# Altium integrated library Cap-El.IntLib: 64 symbols
Pins are listed as number, name and electrical type; pins without a type are passive.

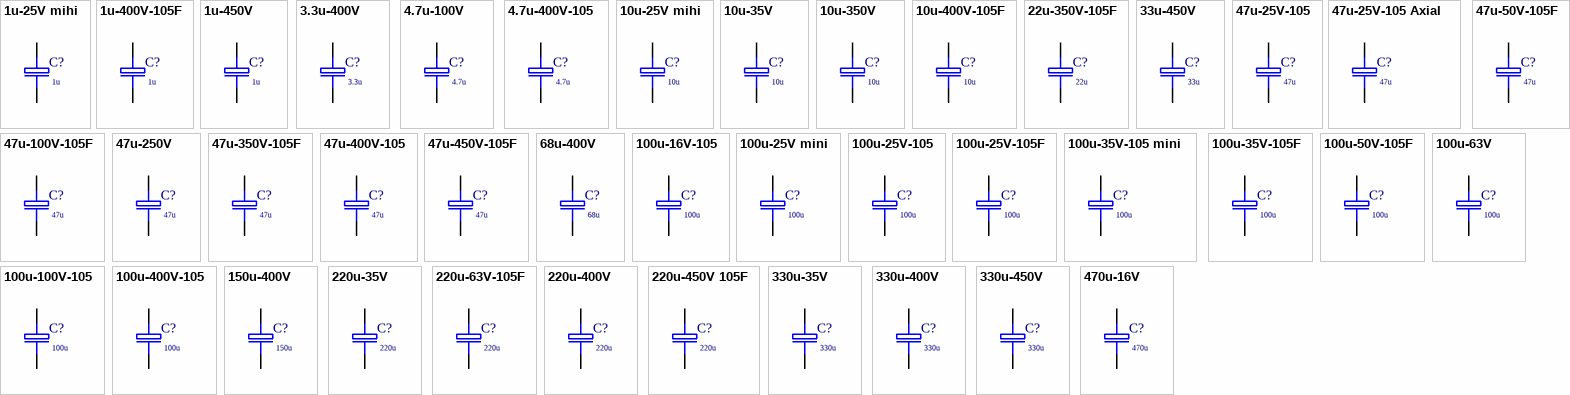
[diagram p0: symbols 1u-25V mihi to 470u-16V]

## 1u-25V mihi
designator C?, comment 1u
25V h7; Price: 0.04; Value: 1u
footprint El-d4-h7-F2.54
simulation model C (Capacitor)
signal-integrity model C
pins: 1, 2
1 alternate drawing of the same symbol

## 1u-400V-105F
designator C?, comment 1u
400V 105F; Price: 0.09; Value: 1u
footprint El-d8-h12-F3.81
simulation model C (Capacitor)
signal-integrity model C
pins: 1, 2
1 alternate drawing of the same symbol

## 1u-450V
designator C?, comment 1u
450V; Price: 0.07; Value: 1u
footprint El-d8-h12-F3.81
simulation model C (Capacitor)
signal-integrity model C
pins: 1, 2
1 alternate drawing of the same symbol

## 3.3u-400V
designator C?, comment 3.3u
400V; Price: 0.11; Value: 3.3u
footprint El-d10-h16-F5.08
simulation model C (Capacitor)
signal-integrity model C
pins: 1, 2
1 alternate drawing of the same symbol

## 4.7u-100V
designator C?, comment 4.7u
100V; Price: 0.125; Value: 4.7u
footprint El-d5-h11-F2.54
simulation model C (Capacitor)
signal-integrity model C
pins: 1, 2
1 alternate drawing of the same symbol

## 4.7u-400V-105
designator C?, comment 4.7u
400V 105; Price: 0.11; VALUE: 4.7u
footprint El-d10-h16-F5.08
simulation model C (Capacitor)
signal-integrity model C
pins: 1, 2
1 alternate drawing of the same symbol

## 10u-25V mihi
designator C?, comment 10u
25V h7; Price: 0.04; Value: 10u
footprint El-d4-h7-F2.54
simulation model C (Capacitor)
signal-integrity model C
pins: 1, 2
1 alternate drawing of the same symbol

## 10u-35V
designator C?, comment 10u
35V; Price: 0.04; Value: 10u
footprint El-d5-h11-F2.54
simulation model C (Capacitor)
signal-integrity model C
pins: 1, 2
1 alternate drawing of the same symbol

## 10u-350V
designator C?, comment 10u
350V; Price: 0.17; Value: 10u
footprint El-d10-h21-F5.08
simulation model C (Capacitor)
signal-integrity model C
pins: 1, 2
1 alternate drawing of the same symbol

## 10u-400V-105F
designator C?, comment 10u
400V-105F; Price: 0.11; VALUE: 10u
footprint El-d13-h21-F5.08
simulation model C (Capacitor)
signal-integrity model C
pins: 1, 2
1 alternate drawing of the same symbol

## 22u-350V-105F
designator C?, comment 22u
350V 105F; Price: 0.31; Value: 22u
footprint El-d13-h21-F5.08
simulation model C (Capacitor)
signal-integrity model C
pins: 1, 2
1 alternate drawing of the same symbol

## 33u-450V
designator C?, comment 33u
450V; Price: 0.72; Value: 33u
footprint El-d16-h31-F7.62
simulation model C (Capacitor)
signal-integrity model C
pins: 1, 2
1 alternate drawing of the same symbol

## 47u-25V-105
designator C?, comment 47u
25V-105; Price: 0.06; Value: 47u
footprint El-d5-h11-F2.54
simulation model C (Capacitor)
signal-integrity model C
pins: 1, 2
1 alternate drawing of the same symbol

## 47u-25V-105 Axial
designator C?, comment 47u
Vishay - MAL202136479E3; Price: 0.06; Value: 47u
footprint EL-Axial 4.5x10 F15.24
simulation model C (Capacitor)
signal-integrity model C
pins: 1, 2
1 alternate drawing of the same symbol

## 47u-50V-105F
designator C?, comment 47u
50V 105F; Price: 0.08; Value: 47u
footprint El-d8-h12-F3.81
simulation model C (Capacitor)
signal-integrity model C
pins: 1, 2
1 alternate drawing of the same symbol

## 47u-100V-105F
designator C?, comment 47u
100V 105F; Price: 0.08; Value: 47u
footprint El-d10-h16-F5.08
simulation model C (Capacitor)
signal-integrity model C
pins: 1, 2
1 alternate drawing of the same symbol

## 47u-250V
designator C?, comment 47u
250V; Price: 0.5; Value: 47u
footprint El-d16-h26-F7.62
simulation model C (Capacitor)
signal-integrity model C
pins: 1, 2
1 alternate drawing of the same symbol

## 47u-350V-105F
designator C?, comment 47u
350V 105F; Price: 1.45; Value: 47u
footprint El-d16-h31-F7.62
simulation model C (Capacitor)
signal-integrity model C
pins: 1, 2
1 alternate drawing of the same symbol

## 47u-400V-105
designator C?, comment 47u
400V 105; Price: 0.72; Value: 47u
footprint El-d16-h36-F5.08
simulation model C (Capacitor)
signal-integrity model C
pins: 1, 2
1 alternate drawing of the same symbol

## 47u-450V-105F
designator C?, comment 47u
450V 105F; Price: 1.45; Value: 47u
footprint El-d18-h32-F7.62
simulation model C (Capacitor)
signal-integrity model C
pins: 1, 2
1 alternate drawing of the same symbol

## 68u-400V
designator C?, comment 68u
400V; Price: 1.73; Value: 68u
footprint El-SnapIn d22-h30
simulation model C (Capacitor)
signal-integrity model C
pins: 1, 2
1 alternate drawing of the same symbol

## 100u-16V-105
designator C?, comment 100u
16V 105; Price: 0.07; Value: 100u
footprint El-d5-h11-F2.54
simulation model C (Capacitor)
signal-integrity model C
pins: 1, 2
1 alternate drawing of the same symbol

## 100u-25V mini
designator C?, comment 100u
25V 85C h6; Price: 0.07; Value: 100u
footprint El-d8-h6-F3.81
simulation model C (Capacitor)
signal-integrity model C
pins: 1, 2
1 alternate drawing of the same symbol

## 100u-25V-105
designator C?, comment 100u
25V 105; Price: 0.07; Value: 100u
footprint El-d5-h11-F2.54
simulation model C (Capacitor)
signal-integrity model C
pins: 1, 2
1 alternate drawing of the same symbol

## 100u-25V-105F
designator C?, comment 100u
25V 105F  0.71om 0.265A; Price: 0.07; Value: 100u
footprint El-d6.3-h11-F2.54
simulation model C (Capacitor)
signal-integrity model C
footprint El-d6.3-h11-F2.54-RA
footprint El-d6.3-h11-F2.54-Rb
pins: 1, 2
1 alternate drawing of the same symbol

## 100u-35V-105 mini
designator C?, comment 100u
35V-105 h9 0.5om 0.4A; Price: 0.07; Value: 100u
footprint El-d8-h9-F3.81
signal-integrity model C
simulation model C (Capacitor)
pins: 1, 2
1 alternate drawing of the same symbol

## 100u-35V-105F
designator C?, comment 100u
35V-105F 0.5om 0.4A; Price: 0.07; Value: 100u
footprint El-d8-h12-F3.81
simulation model C (Capacitor)
signal-integrity model C
pins: 1, 2
1 alternate drawing of the same symbol

## 100u-50V-105F
designator C?, comment 100u
50V-105F; Price: 0.08; Value: 100u
footprint El-d8-h16.5-F3.81
signal-integrity model C
pins: 1, 2
1 alternate drawing of the same symbol

## 100u-63V
designator C?, comment 100u
63V; Price: 0.13; Value: 100u
footprint El-d10-h13-F5.08
simulation model C (Capacitor)
signal-integrity model C
pins: 1, 2
1 alternate drawing of the same symbol

## 100u-100V-105
designator C?, comment 100u
100V 105; Price: 0.23; Value: 100u
footprint El-d13-h21-F5.08
simulation model C (Capacitor)
signal-integrity model C
pins: 1, 2
1 alternate drawing of the same symbol

## 100u-400V-105
designator C?, comment 100u
400V-105; Price: 1.25; Value: 100u
footprint El-d18-h36-F7.62
simulation model C (Capacitor)
signal-integrity model C
pins: 1, 2
1 alternate drawing of the same symbol

## 150u-400V
designator C?, comment 150u
400V; Price: 1.73; Value: 150u
footprint El-SnapIn d25-h30
simulation model C (Capacitor)
signal-integrity model C
pins: 1, 2
1 alternate drawing of the same symbol

## 220u-35V
designator C?, comment 220u
35V; Price: 0.1; Value: 220u
footprint El-d8-h14-F3.81
simulation model C (Capacitor)
signal-integrity model C
pins: 1, 2
1 alternate drawing of the same symbol

## 220u-63V-105F
designator C?, comment 220u
63V 105F 0.08om 0.71A; Price: 0.26; Value: 220u
footprint El-d13-h21-F5.08
simulation model C (Capacitor)
signal-integrity model C
pins: 1, 2
1 alternate drawing of the same symbol

## 220u-400V
designator C?, comment 220u
400V; Price: 2.48; Value: 220u
footprint El-SnapIn d25-h40
simulation model C (Capacitor)
signal-integrity model C
pins: 1, 2
1 alternate drawing of the same symbol

## 220u-450V 105F
designator C?, comment 220u
450V 105F; Price: 5.8; Value: 220u
footprint El-SnapIn d25-h50
simulation model C (Capacitor)
signal-integrity model C
pins: 1, 2
1 alternate drawing of the same symbol

## 330u-35V
designator C?, comment 330u
35V 105F 0.16om; Price: 0.22; Value: 330u
footprint El-d10-h16-F5.08
simulation model C (Capacitor)
signal-integrity model C
pins: 1, 2
1 alternate drawing of the same symbol

## 330u-400V
designator C?, comment 330u
400V; Price: 5.76; Value: 330u
footprint El-SnapIn d30-h40
simulation model C (Capacitor)
signal-integrity model C
pins: 1, 2
1 alternate drawing of the same symbol

## 330u-450V
designator C?, comment 330u
450V; Price: 5.76; Value: 330u
footprint El-SnapIn d35-h50
simulation model C (Capacitor)
signal-integrity model C
pins: 1, 2
1 alternate drawing of the same symbol

## 470u-16V
designator C?, comment 470u
16V; Price: 0.1; Value: 470u
footprint El-d8-h12-F3.81
simulation model C (Capacitor)
signal-integrity model C
pins: 1, 2
1 alternate drawing of the same symbol

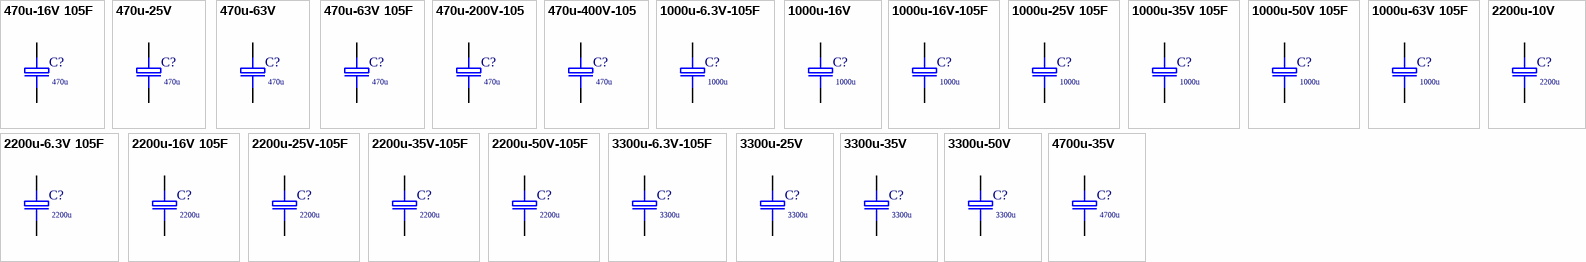
[diagram p1: symbols 470u-16V 105F to 4700u-35V]

## 470u-16V 105F
designator C?, comment 470u
16V 105C 0.12om 0.72A (100kHz); Price: 0.38; Value: 470u
footprint El-d10-h13-F5.08
signal-integrity model C
simulation model C (Capacitor)
pins: 1, 2
1 alternate drawing of the same symbol

## 470u-25V
designator C?, comment 470u
25V; Price: 0.15; Value: 470u
footprint El-d8-h14-F3.81
simulation model C (Capacitor)
signal-integrity model C
pins: 1, 2
1 alternate drawing of the same symbol

## 470u-63V
designator C?, comment 470u
63V; Price: 0.38; Value: 470u
footprint El-d13-h26-F5.08
simulation model C (Capacitor)
signal-integrity model C
pins: 1, 2
1 alternate drawing of the same symbol

## 470u-63V 105F
designator C?, comment 470u
63V 105C 0.053om 1.62A (100kHz); Price: 0.38; Value: 470u
footprint El-d13-h26-F5.08
simulation model C (Capacitor)
signal-integrity model C
pins: 1, 2
1 alternate drawing of the same symbol

## 470u-200V-105
designator C?, comment 470u
200V-105C; Price: 1.8; Value: 470u
footprint El-d22-h41-F10.16
simulation model C (Capacitor)
signal-integrity model C
pins: 1, 2
1 alternate drawing of the same symbol

## 470u-400V-105
designator C?, comment 470u
400V-105C; Price: 5.33; Value: 470u
footprint El-SnapIn d30-h40
simulation model C (Capacitor)
signal-integrity model C
pins: 1, 2
1 alternate drawing of the same symbol

## 1000u-6.3V-105F
designator C?, comment 1000u
6.3V 105C 0.170om 0.555A; Price: 0.16; Value: 1000u
footprint El-d8-h12-F3.81
simulation model C (Capacitor)
signal-integrity model C
pins: 1, 2
1 alternate drawing of the same symbol

## 1000u-16V
designator C?, comment 1000u
16V; Price: 0.18; Value: 1000u
footprint El-d10-h16-F5.08
simulation model C (Capacitor)
signal-integrity model C
pins: 1, 2
1 alternate drawing of the same symbol

## 1000u-16V-105F
designator C?, comment 1000u
16V-105C 0.068om 1.2A; Price: 0.16; Value: 1000u
footprint El-d10-h21-F5.08
simulation model C (Capacitor)
signal-integrity model C
pins: 1, 2
1 alternate drawing of the same symbol

## 1000u-25V 105F
designator C?, comment 1000u
25V 105C 45m 1.65A; Price: 0.32; Value: 1000u
footprint El-d13-h21-F5.08
simulation model C (Capacitor)
signal-integrity model C
pins: 1, 2
1 alternate drawing of the same symbol

## 1000u-35V 105F
designator C?, comment 1000u
35V 105C 34m 1.8A 5000h; Price: 0.42; Value: 1000u
footprint El-d13-h21-F5.08
simulation model C (Capacitor)
signal-integrity model C
pins: 1, 2
1 alternate drawing of the same symbol

## 1000u-50V 105F
designator C?, comment 1000u
50V 105C 30m 2.12A 5000h; Price: 0.67; Value: 1000u
footprint El-d16-h26-F7.62
simulation model C (Capacitor)
signal-integrity model C
pins: 1, 2
1 alternate drawing of the same symbol

## 1000u-63V 105F
designator C?, comment 1000u
63V 105C 29m 2.18A 5000h; Price: 1.27; Value: 1000u
footprint El-d18-h32-F7.62
simulation model C (Capacitor)
signal-integrity model C
pins: 1, 2
1 alternate drawing of the same symbol

## 2200u-6.3V 105F
designator C?, comment 2200u
6.3V 105C 68m 1.05A; Price: 0.22; Value: 2200u
footprint El-d10-h21-F5.08
simulation model C (Capacitor)
signal-integrity model C
pins: 1, 2
1 alternate drawing of the same symbol

## 2200u-10V
designator C?, comment 2200u
10V; Price: 0.17; Value: 2200u
footprint El-d10-h21-F5.08
simulation model C (Capacitor)
signal-integrity model C
pins: 1, 2
1 alternate drawing of the same symbol

## 2200u-16V 105F
designator C?, comment 2200u
16V 105C 39m 1.9A; Price: 0.36; Value: 2200u
footprint El-d13-h21-F5.08
simulation model C (Capacitor)
signal-integrity model C
pins: 1, 2
1 alternate drawing of the same symbol

## 2200u-25V-105F
designator C?, comment 2200u
25V 105C 36m 2.1A; Price: 0.45; Value: 2200u
footprint El-d16-h26-F7.62
simulation model C (Capacitor)
signal-integrity model C
pins: 1, 2
1 alternate drawing of the same symbol

## 2200u-35V-105F
designator C?, comment 2200u
35V 105C 22m 2.55A; Price: 0.63; Value: 2200u
footprint El-d16-h31-F7.62
simulation model C (Capacitor)
signal-integrity model C
pins: 1, 2
1 alternate drawing of the same symbol

## 2200u-50V-105F
designator C?, comment 2200u
50V 105C 32m 3A; Price: 0.80; Value: 2200u
footprint El-d18-h36-F7.62
simulation model C (Capacitor)
signal-integrity model C
pins: 1, 2
1 alternate drawing of the same symbol

## 3300u-6.3V-105F
designator C?, comment 3300u
6.3V 105C 60m 1.65A; Price: 0.32; Value: 3300u
footprint El-d13-h21-F5.08
simulation model C (Capacitor)
signal-integrity model C
pins: 1, 2
1 alternate drawing of the same symbol

## 3300u-25V
designator C?, comment 3300u
25V; Price: 0.46; Value: 3300u
footprint El-d16-h26-F7.62
simulation model C (Capacitor)
signal-integrity model C
pins: 1, 2
1 alternate drawing of the same symbol

## 3300u-35V
designator C?, comment 3300u
35V; Price: 0.72; Value: 3300u
footprint El-d16-h31-F7.62
simulation model C (Capacitor)
signal-integrity model C
pins: 1, 2
1 alternate drawing of the same symbol

## 3300u-50V
designator C?, comment 3300u
50V; Price: 1.09; Value: 3300u
footprint El-d18-h36-F7.62
simulation model C (Capacitor)
signal-integrity model C
pins: 1, 2
1 alternate drawing of the same symbol

## 4700u-35V
designator C?, comment 4700u
35V; Price: 0.85; Value: 4700u
footprint El-d18-h36-F7.62
simulation model C (Capacitor)
signal-integrity model C
pins: 1, 2
1 alternate drawing of the same symbol